# Altium footprint library General.PCBLIB: 130 footprints (part 3 of 9)
Each footprint in its own frame and in the unit in brackets; x right, y up, seen from the top. Pads: shape width x height; smd on the part's side, far side on the other; paste and mask are expansions set on the pad; w line width, h text height; cw(c..) or ccw(c..) is an arc to the next point about the centre after c.
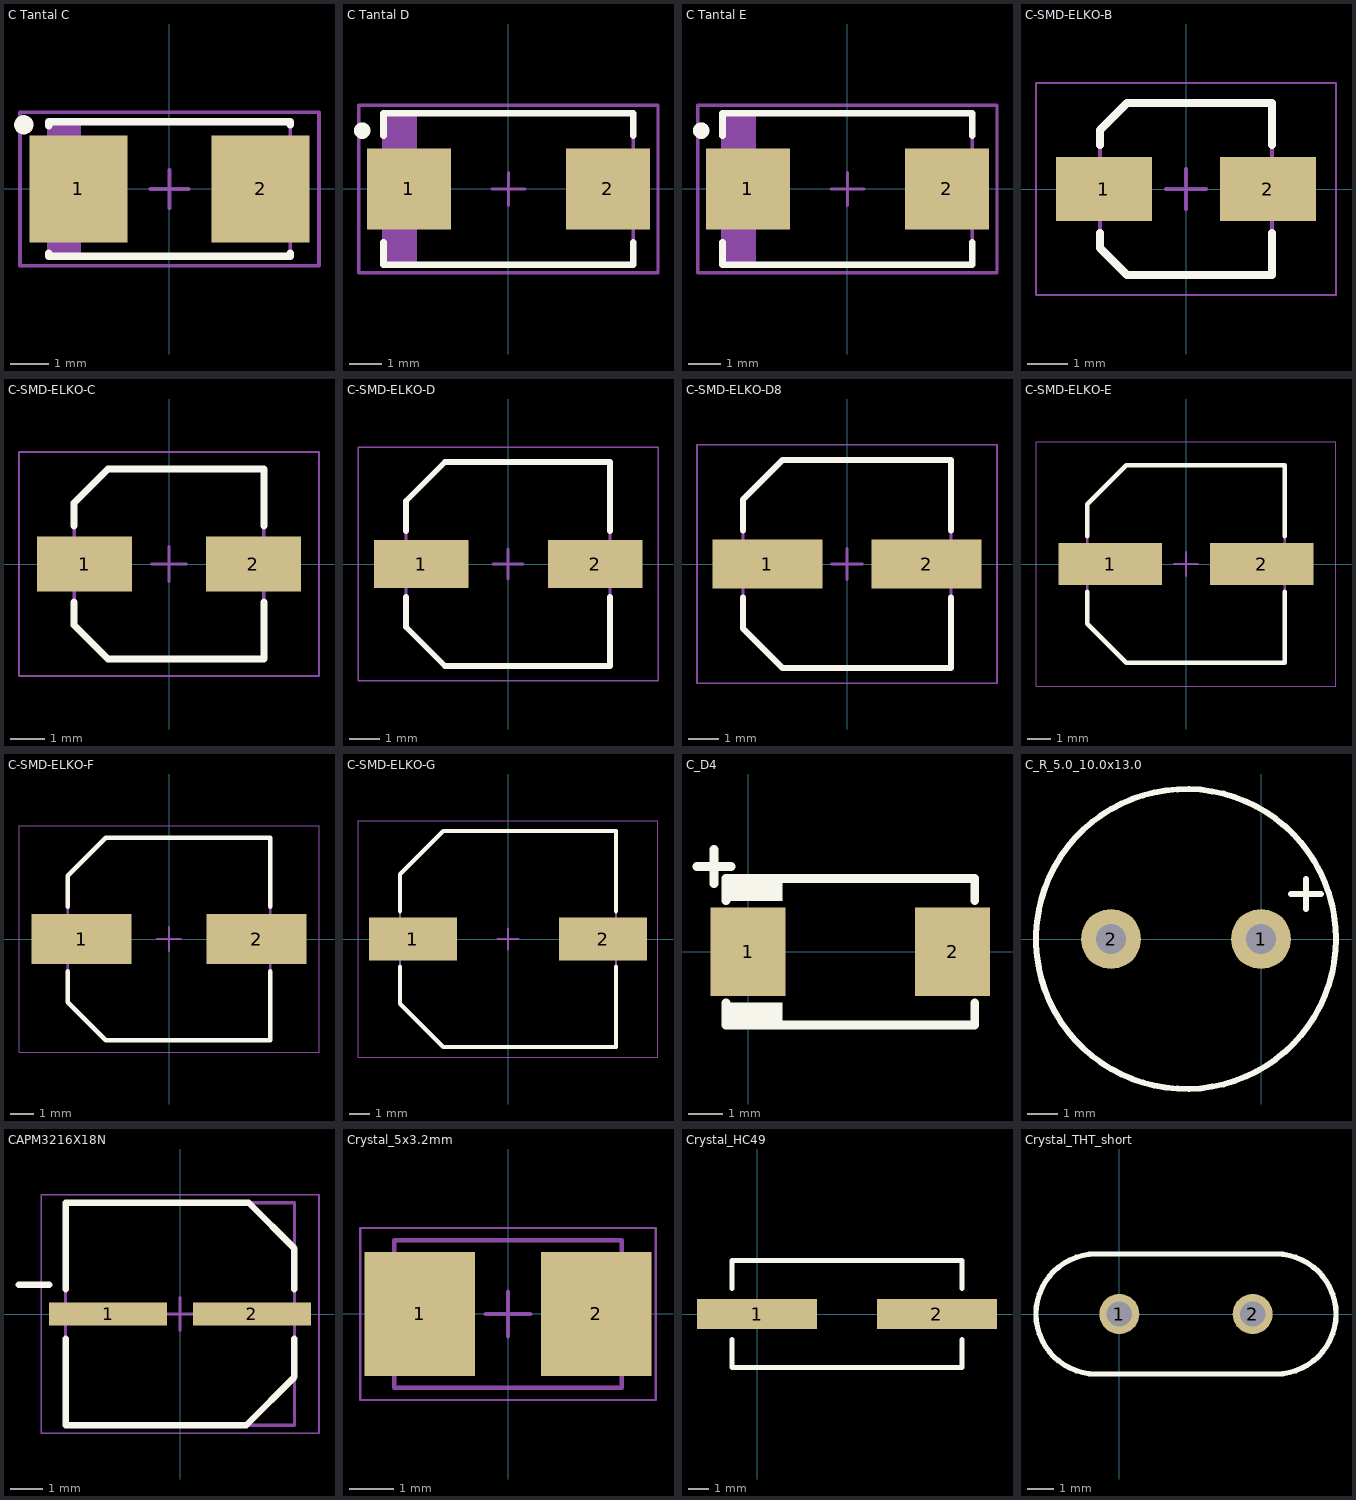
[diagram p2: the footprints below, top view; thin cyan lines are the x and y axes]

## C Tantal C [mm] "Molded Capacitor, 2-Leads, Body 6,0x3,2mm, IPC Medium Density"
height 2.8
pads (2):
  rect 2.55x2.794 smd: 1(-2.375,0) 2(2.375,0)
Top Overlay:
  circle w0.25: c-3.8,1.675 r0.125
  lines w0.2: -3.15,-1.676 -3.15,-1.75 3.15,-1.75 3.15,-1.676 ; -3.15,1.651 -3.15,1.75 3.15,1.75 3.15,1.676
Top Body, 3D Models:
  rectangle: -3.15,-1.75 -2.303,1.75
  lines w0.1: -3.15,-1.75 3.15,-1.75 3.15,1.75 -3.15,1.75 -3.15,-1.75
Top Courtyard:
  lines w0.1: -0.5,0 0.5,0 ; 0,-0.5 0,0.5 ; -3.9,-2 3.9,-2 3.9,2 -3.9,2 -3.9,-2
Top DesignatorDoc:
  text ".Designator" at 0,0 h1.2
3D body "User Library-cap_c.step": height 2.53, standoff 0.02, extent -2.972,-1.6 3.022,1.6

## C Tantal D [mm] "Molded Capacitor, 2-Leads, Body 7,3x4,3mm, IPC Medium Density"
height 3.1
pads (2):
  rect 2.55x2.45 smd: 1(-3.025,0) 2(3.025,0)
Top Overlay:
  circle w0.25: c-4.45,1.775 r0.125
  lines w0.2: -3.8,-1.625 -3.8,-2.3 3.8,-2.3 3.8,-1.625 ; -3.8,1.625 -3.8,2.3 3.8,2.3 3.8,1.625
Top Body, 3D Models:
  rectangle: -3.8,-2.3 -2.778,2.3
  lines w0.1: -3.8,-2.3 -3.8,2.3 3.8,2.3 3.8,-2.3 -3.8,-2.3
Top Courtyard:
  lines w0.1: -0.5,0 0.5,0 ; 0,-0.5 0,0.5 ; -4.55,-2.55 -4.55,2.55 4.55,2.55 4.55,-2.55 -4.55,-2.55
Top DesignatorDoc:
  text ".Designator" at 0,0 h1.2
3D body "User Library-cap_d.step": height 2.83, standoff 0.02, extent -3.647,-2.159 3.647,2.141

## C Tantal E [mm] "Molded Capacitor, 2-Leads, Body 7,3x4,3mm, IPC Medium Density"
height 4.3
pads (2):
  rect 2.55x2.45 smd: 1(-3.025,0) 2(3.025,0)
Top Overlay:
  circle w0.25: c-4.45,1.775 r0.125
  lines w0.2: -3.8,-1.625 -3.8,-2.3 3.8,-2.3 3.8,-1.625 ; -3.8,1.625 -3.8,2.3 3.8,2.3 3.8,1.625
Top Body, 3D Models:
  rectangle: -3.8,-2.3 -2.778,2.3
  lines w0.1: -3.8,-2.3 3.8,-2.3 3.8,2.3 -3.8,2.3 -3.8,-2.3
Top Courtyard:
  lines w0.1: -0.5,0 0.5,0 ; 0,-0.5 0,0.5 ; -4.55,-2.55 4.55,-2.55 4.55,2.55 -4.55,2.55 -4.55,-2.55
Top DesignatorDoc:
  text ".Designator" at 0,0 h1.2
3D body "User Library-cap_e.step": height 4.13, standoff 0.02, extent -3.647,-2.141 3.647,2.159

## C-SMD-ELKO-B [mm] "Aluminum Electrolytic Capacitor, Body 4.20x4.20x6.10mm, IPC Medium Density"
height 6.1
pads (2):
  rect 2.4x1.6 smd: 1(-2.05,0) 2(2.05,0)
Top Overlay:
  lines w0.2: -2.15,-1.1 -2.15,-1.475 -1.475,-2.15 2.15,-2.15 2.15,-1.1 ; -2.15,1.1 -2.15,1.475 -1.475,2.15 2.15,2.15 2.15,1.1
Top Body, 3D Models:
  lines w0.1: -2.15,-1.475 -1.475,-2.15 2.15,-2.15 2.15,2.15 -1.475,2.15 -2.15,1.475 -2.15,-1.475
Top Courtyard:
  lines w0.05: -3.75,-2.65 -3.75,2.65 3.75,2.65 3.75,-2.65 -3.75,-2.65
  lines w0.1: -0.5,0 0.5,0 ; 0,-0.5 0,0.5
Top DesignatorDoc:
  text ".Designator" at 0,0 h1.2
3D body "User Library-ALU-B.STEP": height 5.4, standoff 0, extent -2.3,-2.15 2.3,2.15

## C-SMD-ELKO-C [mm] "Aluminum Electrolytic Capacitor, Body 5.30x5.30x6.10mm, IPC Medium Density"
height 6.1
pads (2):
  rect 2.75x1.6 smd: 1(-2.45,0) 2(2.45,0)
Top Overlay:
  lines w0.2: -2.75,-1.1 -2.75,-1.775 -1.775,-2.75 2.75,-2.75 2.75,-1.1 ; -2.75,1.1 -2.75,1.775 -1.775,2.75 2.75,2.75 2.75,1.1
Top Body, 3D Models:
  lines w0.1: -2.75,-1.775 -1.775,-2.75 2.75,-2.75 2.75,2.75 -1.775,2.75 -2.75,1.775 -2.75,-1.775
Top Courtyard:
  lines w0.05: -4.35,-3.25 -4.35,3.25 4.35,3.25 4.35,-3.25 -4.35,-3.25
  lines w0.1: -0.5,0 0.5,0 ; 0,-0.5 0,0.5
Top DesignatorDoc:
  text ".Designator" at 0,0 h1.2
3D body "User Library-ALU-C.STEP": height 5.41, standoff 0, extent -2.95,-2.65 2.95,2.65

## C-SMD-ELKO-D [mm] "Aluminum Electrolytic Capacitor, Body 6.60x6.60x6.10mm, IPC Medium Density"
height 6.1
pads (2):
  rect 3.15x1.6 smd: 1(-2.9,0) 2(2.9,0)
Top Overlay:
  lines w0.2: -3.4,-1.1 -3.4,-2.1 -2.1,-3.4 3.4,-3.4 3.4,-1.1 ; -3.4,1.1 -3.4,2.1 -2.1,3.4 3.4,3.4 3.4,1.1
Top Body, 3D Models:
  lines w0.1: -3.4,-2.1 -2.1,-3.4 3.4,-3.4 3.4,3.4 -2.1,3.4 -3.4,2.1 -3.4,-2.1
Top Courtyard:
  lines w0.05: -5,-3.9 -5,3.9 5,3.9 5,-3.9 -5,-3.9
  lines w0.1: -0.5,0 0.5,0 ; 0,-0.5 0,0.5
Top DesignatorDoc:
  text ".Designator" at 0,0 h1.2
3D body "User Library-ALU-D.STEP": height 5.4, standoff 0, extent -3.5,-3.3 3.5,3.3

## C-SMD-ELKO-D8 [mm] "Aluminum Electrolytic Capacitor, Body 6,60x6,60x8,00mm, IPC Medium Density"
height 8
pads (2):
  rect 3.6x1.6 smd: 1(-2.6,0) 2(2.6,0)
Top Overlay:
  lines w0.2: -3.4,-1.1 -3.4,-2.1 -2.1,-3.4 3.4,-3.4 3.4,-1.1 ; -3.4,1.1 -3.4,2.1 -2.1,3.4 3.4,3.4 3.4,1.1
Top Body, 3D Models:
  lines w0.1: -3.4,-2.1 -2.1,-3.4 3.4,-3.4 3.4,3.4 -2.1,3.4 -3.4,2.1 -3.4,-2.1
Top Courtyard:
  lines w0.05: -4.9,-3.9 -4.9,3.9 4.9,3.9 4.9,-3.9 -4.9,-3.9
  lines w0.1: -0.5,0 0.5,0 ; 0,-0.5 0,0.5
Top DesignatorDoc:
  text ".Designator" at 0,0 h1.2
3D body "User Library-ALU-D8.STEP": height 7.7, standoff 0, extent -3.5,-3.3 3.5,3.3

## C-SMD-ELKO-E [mm] "Aluminum Electrolytic Capacitor, Body 8.30x8.30x6.50mm, IPC Low Density"
height 6.5
pads (2):
  rect 4.45x1.8 smd: 1(-3.25,0) 2(3.25,0)
Top Overlay:
  lines w0.2: -4.25,-1.2 -4.25,-2.575 -2.575,-4.25 4.25,-4.25 4.25,-1.2 ; -4.25,1.2 -4.25,2.575 -2.575,4.25 4.25,4.25 4.25,1.2
Top Body, 3D Models:
  lines w0.1: -4.25,-2.575 -4.25,2.575 -2.575,4.25 4.25,4.25 4.25,-4.25 -2.575,-4.25 -4.25,-2.575
Top Courtyard:
  lines w0.05: -6.45,-5.25 6.45,-5.25 6.45,5.25 -6.45,5.25 -6.45,-5.25
  lines w0.1: -0.5,0 0.5,0 ; 0,-0.5 0,0.5
Top DesignatorDoc:
  text ".Designator" at 0,0 h1.2
3D body "User Library-ALU-E.STEP": height 6.2, standoff 0, extent -4.5,-4.15 4.5,4.15

## C-SMD-ELKO-F [mm] "Aluminum Electrolytic Capacitor, Body 8.30x8.30x10.50mm, IPC Medium Density"
height 10.5
pads (2):
  rect 4.2x2.1 smd: 1(-3.675,0) 2(3.675,0)
Top Overlay:
  lines w0.2: -4.25,-1.35 -4.25,-2.65 -2.65,-4.25 4.25,-4.25 4.25,-1.35 ; -4.25,1.35 -4.25,2.65 -2.65,4.25 4.25,4.25 4.25,1.35
Top Body, 3D Models:
  lines w0.1: -4.25,-2.65 -2.65,-4.25 4.25,-4.25 4.25,4.25 -2.65,4.25 -4.25,2.65 -4.25,-2.65
Top Courtyard:
  lines w0.05: -6.3,-4.75 -6.3,4.75 6.3,4.75 6.3,-4.75 -6.3,-4.75
  lines w0.1: -0.5,0 0.5,0 ; 0,-0.5 0,0.5
Top DesignatorDoc:
  text ".Designator" at 0,0 h1.2
3D body "User Library-ALU-F.STEP": height 10.2, standoff 0, extent -4.95,-4.15 4.95,4.15

## C-SMD-ELKO-G [mm] "Aluminum Electrolytic Capacitor, Body 10.30x10.30x10.50mm, IPC Medium Density"
height 10.5
pads (2):
  rect 4.3x2.1 smd: 1(-4.625,0) 2(4.625,0)
Top Overlay:
  lines w0.2: -5.25,-1.35 -5.25,-3.15 -3.15,-5.25 5.25,-5.25 5.25,-1.35 ; -5.25,1.35 -5.25,3.15 -3.15,5.25 5.25,5.25 5.25,1.35
Top Body, 3D Models:
  lines w0.1: -5.25,-3.15 -5.25,3.15 -3.15,5.25 5.25,5.25 5.25,-5.25 -3.15,-5.25 -5.25,-3.15
Top Courtyard:
  lines w0.05: -7.3,-5.75 7.3,-5.75 7.3,5.75 -7.3,5.75 -7.3,-5.75
  lines w0.1: -0.5,0 0.5,0 ; 0,-0.5 0,0.5
Top DesignatorDoc:
  text ".Designator" at 0,0 h1.2
3D body "User Library-ALU-G.STEP": height 10.2, standoff 0, extent -5.8,-5.15 5.8,5.15

## C_D4 [mm]
pads (2):
  rect 2.2x2.6 smd: 1(0,0) 2(6,0)
Top Overlay:
  region: -0.625,1.5 1,1.5 1,2.25 -0.625,2.25
  region: -0.625,-2.25 1,-2.25 1,-1.5 -0.625,-1.5
  lines w0.254: -1.5,2.5 -0.5,2.5 ; -1,2 -1,3 ; -0.65,-1.5 -0.65,-2.15 6.65,-2.15 6.65,-1.5 ; -0.65,1.5 -0.65,2.15 6.65,2.15 6.65,1.5
Top DesignatorDoc:
  text ".Designator" at 3.175,0 h1.2

## C_R_5.0_10.0x13.0 [mm] "Capacitor radial FI=10mm Height=13mm, Pitch=5mm"
height 13
pads (2):
  round 2 hole 1: 1(0,0) 2(-5,0)
Top Overlay:
  circle w0.2: c-2.5,0 r5
  lines w0.2: 0.992,1.5 2.008,1.5 ; 1.5,0.992 1.5,1.246 1.5,1.754 1.5,2.008
Top DesignatorDoc:
  text ".Designator" at -2.54,0 h1.2
3D body "User Library-CE_R200_D400_H500.step": height 13.2, standoff -2.2, extent -7.58,-5.078 2.58,5.079

## CAPM3216X18N [mm]
height 6.1
pads (2):
  rect 3.6x0.7 smd: 1(-2.2,0) 2(2.2,0)
Top Overlay:
  lines w0.2: -4.925,0.9 -4,0.9 ; -3.5,-0.75 -3.5,-3.4 2.025,-3.4 3.5,-1.925 3.5,-0.75 ; -3.5,0.75 -3.5,3.4 2.1,3.4 3.5,2 3.5,0.75
Top Body, 3D Models:
  lines w0.1: -3.5,-3.4 -3.5,3.4 3.5,3.4 3.5,-3.4 -3.5,-3.4
Top Courtyard:
  lines w0.05: -4.25,-3.65 -4.25,3.65 4.25,3.65 4.25,-3.65 -4.25,-3.65
  lines w0.1: -0.5,0 0.5,0 ; 0,-0.5 0,0.5
Top DesignatorDoc:
  text ".Designator" at 0,0 h1.2
3D body: height 6.1, standoff 0, extent -3.5,-3.4 3.5,3.4

## Crystal_5x3.2mm [mm]
height 1.35
pads (2):
  rect 2.5x2.8 smd: 1(-2,0) 2(2,0)
Top Body, 3D Models:
  lines w0.1: -2.575,-1.675 -2.575,1.675 2.575,1.675 2.575,-1.675 -2.575,-1.675
Top Courtyard:
  lines w0.05: -3.35,-1.95 -3.35,1.95 3.35,1.95 3.35,-1.95 -3.35,-1.95
  lines w0.1: -0.5,0 0.5,0 ; 0,-0.5 0,0.5
Top DesignatorDoc:
  text ".Designator" at 0,0 h1.2
3D body: height 1.35, standoff 0, extent -2.575,-1.675 2.575,1.675

## Crystal_HC49 [mm] "Crystall SMD short HC49"
height 4
pads (2):
  rect 6x1.5 smd: 1(0,0) 2(8.999,0)
Top Overlay:
  lines w0.254: -1.251,-1.27 -1.251,-2.667 10.25,-2.667 10.25,-1.27 ; -1.251,1.27 -1.251,2.667 10.25,2.667 10.25,1.27
Top DesignatorDoc:
  text ".Designator" at 4.318,0 h1.2
3D body "User Library-hc49_cystal.step": height 5.08, standoff 0, extent -2.128,-2.413 11.272,2.487

## Crystal_THT_short [mil] "Crystal short THT"
height 157.48
pads (2):
  round 60 hole 38: 1(0,0) 2(200,0)
Top Overlay:
  lines w8: -35,-90 cw(c-35,0) -35,90 235,90 cw(c235,0) 235,-90 -35,-90
Top DesignatorDoc:
  text ".Designator" at 100,0 h47.24
3D body "User Library-HP49US.step": height 138.4, standoff -156.88, extent -123.43,-90 323.43,93.07